# Altium schematic symbol library jlcpcb_2025_04_inductors_extended_0603.schlib: 1269 symbols (part 2 of 7) (continued)
## FHW0603UCR20JST
designator L?  Inductance: 200nH
Inductor, 200nH, ±5%, SMD 0603; Manufacturer: FH(Guangdong Fenghua Advanced Tech); Manufacturer Part Number: FHW0603UCR20JST; Package Size: 0603; JLCPCB Basic Part: No; JLCPCB Part Number: C395037; Supplier 1: LCSC; Category: Inductors; Supplier Part Number 1: C395037; Tolerance: ±5%; RoHS: Yes; ComponentLink1Description: Datasheet; ComponentLink1URL: https://wmsc.lcsc.com/wmsc/upload/file/pdf/v2/lcsc/2302231208_FH--Guangdong-Fenghua-Advanced-Tech-FHW0603UCR20JST_C395037.pdf; ComponentLink2Description: JLCPCB Part URL; ComponentLink2URL: https://jlcpcb.com/partdetail/C395037; ComponentLink3Description: LCSC Part URL; ComponentLink3URL: https://lcsc.com/product-detail/Inductors-SMD_FH-Guangdong-Fenghua-Advanced-Tech-FH-Guangdong-Fenghua-Advanced-Tech-FHW0603UCR20JST_C395037.html
footprint IND-0603 (0603 (1608M) Inductor)
pins: 1, 2

## FHW0603UCR22JST
designator L?  Inductance: 220nH
Inductor, 220nH, ±5%, 2.1Ω, 200mA, SMD 0603; Manufacturer: FH(Guangdong Fenghua Advanced Tech); Manufacturer Part Number: FHW0603UCR22JST; Self-Resonant Frequency: 900MHz; Q Factor: 25@100MHz; Package Size: 0603; JLCPCB Basic Part: No; JLCPCB Part Number: C295701; Supplier 1: LCSC; Category: Inductors; Supplier Part Number 1: C295701; Tolerance: ±5%; Rated Current: 200mA; DC Resistance: 2.1Ω; RoHS: Yes; ComponentLink1Description: Datasheet; ComponentLink1URL: https://wmsc.lcsc.com/wmsc/upload/file/pdf/v2/lcsc/2302231208_FH--Guangdong-Fenghua-Advanced-Tech-FHW0603UCR22JST_C295701.pdf; ComponentLink2Description: JLCPCB Part URL; ComponentLink2URL: https://jlcpcb.com/partdetail/C295701; ComponentLink3Description: LCSC Part URL; ComponentLink3URL: https://lcsc.com/product-detail/Inductors-SMD_FH-Guangdong-Fenghua-Advanced-Tech-FH-Guangdong-Fenghua-Advanced-Tech-FHW0603UCR22JST_C295701.html
footprint IND-0603 (0603 (1608M) Inductor)
pins: 1, 2

## FHW0603UCR27JST
designator L?  Inductance: 270nH
Inductor, 270nH, ±5%, 2.3Ω, 170mA, SMD 0603; Manufacturer: FH(Guangdong Fenghua Advanced Tech); Manufacturer Part Number: FHW0603UCR27JST; Self-Resonant Frequency: 900MHz; Q Factor: 24@100MHz; Package Size: 0603; JLCPCB Basic Part: No; JLCPCB Part Number: C317990; Supplier 1: LCSC; Category: Inductors; Supplier Part Number 1: C317990; Tolerance: ±5%; Rated Current: 170mA; DC Resistance: 2.3Ω; RoHS: Yes; ComponentLink1Description: Datasheet; ComponentLink1URL: https://wmsc.lcsc.com/wmsc/upload/file/pdf/v2/lcsc/2302231208_FH--Guangdong-Fenghua-Advanced-Tech-FHW0603UCR27JST_C317990.pdf; ComponentLink2Description: JLCPCB Part URL; ComponentLink2URL: https://jlcpcb.com/partdetail/C317990; ComponentLink3Description: LCSC Part URL; ComponentLink3URL: https://lcsc.com/product-detail/Inductors-SMD_FH-Guangdong-Fenghua-Advanced-Tech-FH-Guangdong-Fenghua-Advanced-Tech-FHW0603UCR27JST_C317990.html
footprint IND-0603 (0603 (1608M) Inductor)
pins: 1, 2

## FHW0603UCR39JST
designator L?  Inductance: 390nH
Inductor, 390nH, ±5%, 4.35Ω, 100mA, SMD 0603; Manufacturer: FH(Guangdong Fenghua Advanced Tech); Manufacturer Part Number: FHW0603UCR39JST; Self-Resonant Frequency: 800MHz; Q Factor: 25@100MHz; Package Size: 0603; JLCPCB Basic Part: No; JLCPCB Part Number: C295702; Supplier 1: LCSC; Category: Inductors; Supplier Part Number 1: C295702; Tolerance: ±5%; Rated Current: 100mA; DC Resistance: 4.35Ω; RoHS: Yes; ComponentLink1Description: Datasheet; ComponentLink1URL: https://wmsc.lcsc.com/wmsc/upload/file/pdf/v2/lcsc/2302231208_FH--Guangdong-Fenghua-Advanced-Tech-FHW0603UCR39JST_C295702.pdf; ComponentLink2Description: JLCPCB Part URL; ComponentLink2URL: https://jlcpcb.com/partdetail/C295702; ComponentLink3Description: LCSC Part URL; ComponentLink3URL: https://lcsc.com/product-detail/Inductors-SMD_FH-Guangdong-Fenghua-Advanced-Tech-FH-Guangdong-Fenghua-Advanced-Tech-FHW0603UCR39JST_C295702.html
footprint IND-0603 (0603 (1608M) Inductor)
pins: 1, 2

## FHW0603UCR47JST
designator L?  Inductance: 470nH
Inductor, 470nH, ±5%, 7Ω, 75mA, SMD 0603; Manufacturer: FH(Guangdong Fenghua Advanced Tech); Manufacturer Part Number: FHW0603UCR47JST; Self-Resonant Frequency: 700MHz; Q Factor: 25@100MHz; Package Size: 0603; JLCPCB Basic Part: No; JLCPCB Part Number: C395038; Supplier 1: LCSC; Category: Inductors; Supplier Part Number 1: C395038; Tolerance: ±5%; Rated Current: 75mA; DC Resistance: 7Ω; RoHS: Yes; ComponentLink1Description: Datasheet; ComponentLink1URL: https://wmsc.lcsc.com/wmsc/upload/file/pdf/v2/lcsc/2302231208_FH--Guangdong-Fenghua-Advanced-Tech-FHW0603UCR47JST_C395038.pdf; ComponentLink2Description: JLCPCB Part URL; ComponentLink2URL: https://jlcpcb.com/partdetail/C395038; ComponentLink3Description: LCSC Part URL; ComponentLink3URL: https://lcsc.com/product-detail/Inductors-SMD_FH-Guangdong-Fenghua-Advanced-Tech-FH-Guangdong-Fenghua-Advanced-Tech-FHW0603UCR47JST_C395038.html
footprint IND-0603 (0603 (1608M) Inductor)
pins: 1, 2

## FHW0603UF1R0JST
designator L?  Inductance: 1uH
Inductor, 1uH, ±5%, 1.5Ω, 330mA, SMD 0603; Manufacturer: FH(Guangdong Fenghua Advanced Tech); Manufacturer Part Number: FHW0603UF1R0JST; Self-Resonant Frequency: 400MHz; Q Factor: 12@7.9MHz; Package Size: 0603; JLCPCB Basic Part: No; JLCPCB Part Number: C127458; Supplier 1: LCSC; Category: Inductors; Supplier Part Number 1: C127458; Tolerance: ±5%; Rated Current: 330mA; DC Resistance: 1.5Ω; RoHS: Yes; ComponentLink1Description: Datasheet; ComponentLink1URL: https://wmsc.lcsc.com/wmsc/upload/file/pdf/v2/lcsc/2303141900_FH--Guangdong-Fenghua-Advanced-Tech-FHW0603UF1R0JST_C127458.pdf; ComponentLink2Description: JLCPCB Part URL; ComponentLink2URL: https://jlcpcb.com/partdetail/C127458; ComponentLink3Description: LCSC Part URL; ComponentLink3URL: https://lcsc.com/product-detail/Inductors-SMD_FH-Guangdong-Fenghua-Advanced-Tech-FH-Guangdong-Fenghua-Advanced-Tech-FHW0603UF1R0JST_C127458.html
footprint IND-0603 (0603 (1608M) Inductor)
pins: 1, 2

## FHW0603UF1R2JST
designator L?  Inductance: 1.2uH
Inductor, 1.2uH, ±5%, 1.7Ω, 320mA, SMD 0603; Manufacturer: FH(Guangdong Fenghua Advanced Tech); Manufacturer Part Number: FHW0603UF1R2JST; Self-Resonant Frequency: 380MHz; Q Factor: 12@7.9MHz; Package Size: 0603; JLCPCB Basic Part: No; JLCPCB Part Number: C393979; Supplier 1: LCSC; Category: Inductors; Supplier Part Number 1: C393979; Tolerance: ±5%; Rated Current: 320mA; DC Resistance: 1.7Ω; RoHS: Yes; ComponentLink1Description: Datasheet; ComponentLink1URL: https://wmsc.lcsc.com/wmsc/upload/file/pdf/v2/lcsc/2303141830_FH--Guangdong-Fenghua-Advanced-Tech-FHW0603UF1R2JST_C393979.pdf; ComponentLink2Description: JLCPCB Part URL; ComponentLink2URL: https://jlcpcb.com/partdetail/C393979; ComponentLink3Description: LCSC Part URL; ComponentLink3URL: https://lcsc.com/product-detail/Inductors-SMD_FH-Guangdong-Fenghua-Advanced-Tech-FH-Guangdong-Fenghua-Advanced-Tech-FHW0603UF1R2JST_C393979.html
footprint IND-0603 (0603 (1608M) Inductor)
pins: 1, 2

## FHW0603UF1R5JST
designator L?  Inductance: 1.5uH
Inductor, 1.5uH, ±5%, 1.9Ω, 310mA, SMD 0603; Manufacturer: FH(Guangdong Fenghua Advanced Tech); Manufacturer Part Number: FHW0603UF1R5JST; Self-Resonant Frequency: 300MHz; Q Factor: 12@7.9MHz; Package Size: 0603; JLCPCB Basic Part: No; JLCPCB Part Number: C393980; Supplier 1: LCSC; Category: Inductors; Supplier Part Number 1: C393980; Tolerance: ±5%; Rated Current: 310mA; DC Resistance: 1.9Ω; RoHS: Yes; ComponentLink1Description: Datasheet; ComponentLink1URL: https://wmsc.lcsc.com/wmsc/upload/file/pdf/v2/lcsc/2303141830_FH--Guangdong-Fenghua-Advanced-Tech-FHW0603UF1R5JST_C393980.pdf; ComponentLink2Description: JLCPCB Part URL; ComponentLink2URL: https://jlcpcb.com/partdetail/C393980; ComponentLink3Description: LCSC Part URL; ComponentLink3URL: https://lcsc.com/product-detail/Inductors-SMD_FH-Guangdong-Fenghua-Advanced-Tech-FH-Guangdong-Fenghua-Advanced-Tech-FHW0603UF1R5JST_C393980.html
footprint IND-0603 (0603 (1608M) Inductor)
pins: 1, 2

## FHW0603UF1R8JST
designator L?  Inductance: 1.8uH
Inductor, 1.8uH, ±5%, 2.2Ω, 300mA, SMD 0603; Manufacturer: FH(Guangdong Fenghua Advanced Tech); Manufacturer Part Number: FHW0603UF1R8JST; Self-Resonant Frequency: 180MHz; Q Factor: 12@7.9MHz; Package Size: 0603; JLCPCB Basic Part: No; JLCPCB Part Number: C393981; Supplier 1: LCSC; Category: Inductors; Supplier Part Number 1: C393981; Tolerance: ±5%; Rated Current: 300mA; DC Resistance: 2.2Ω; RoHS: Yes; ComponentLink1Description: Datasheet; ComponentLink1URL: https://wmsc.lcsc.com/wmsc/upload/file/pdf/v2/lcsc/2303141830_FH--Guangdong-Fenghua-Advanced-Tech-FHW0603UF1R8JST_C393981.pdf; ComponentLink2Description: JLCPCB Part URL; ComponentLink2URL: https://jlcpcb.com/partdetail/C393981; ComponentLink3Description: LCSC Part URL; ComponentLink3URL: https://lcsc.com/product-detail/Inductors-SMD_FH-Guangdong-Fenghua-Advanced-Tech-FH-Guangdong-Fenghua-Advanced-Tech-FHW0603UF1R8JST_C393981.html
footprint IND-0603 (0603 (1608M) Inductor)
pins: 1, 2

## FHW0603UF2R2JST
designator L?  Inductance: 2.2uH
Inductor, 2.2uH, ±5%, 2.3Ω, 280mA, SMD 0603; Manufacturer: FH(Guangdong Fenghua Advanced Tech); Manufacturer Part Number: FHW0603UF2R2JST; Self-Resonant Frequency: 180MHz; Q Factor: 12@7.9MHz; Package Size: 0603; JLCPCB Basic Part: No; JLCPCB Part Number: C393982; Supplier 1: LCSC; Category: Inductors; Supplier Part Number 1: C393982; Tolerance: ±5%; Rated Current: 280mA; DC Resistance: 2.3Ω; RoHS: Yes; ComponentLink1Description: Datasheet; ComponentLink1URL: https://wmsc.lcsc.com/wmsc/upload/file/pdf/v2/lcsc/2303141830_FH--Guangdong-Fenghua-Advanced-Tech-FHW0603UF2R2JST_C393982.pdf; ComponentLink2Description: JLCPCB Part URL; ComponentLink2URL: https://jlcpcb.com/partdetail/C393982; ComponentLink3Description: LCSC Part URL; ComponentLink3URL: https://lcsc.com/product-detail/Inductors-SMD_FH-Guangdong-Fenghua-Advanced-Tech-FH-Guangdong-Fenghua-Advanced-Tech-FHW0603UF2R2JST_C393982.html
footprint IND-0603 (0603 (1608M) Inductor)
pins: 1, 2

## FHW0603UF2R2KST
designator L?  Inductance: 2.2uH
Inductor, 2.2uH, ±10%, 2.3Ω, 280mA, SMD 0603; Manufacturer: FH(Guangdong Fenghua Advanced Tech); Manufacturer Part Number: FHW0603UF2R2KST; Package Size: 0603; JLCPCB Basic Part: No; JLCPCB Part Number: C127459; Supplier 1: LCSC; Category: Inductors; Supplier Part Number 1: C127459; Tolerance: ±10%; Rated Current: 280mA; DC Resistance: 2.3Ω; RoHS: Yes; ComponentLink1Description: Datasheet; ComponentLink1URL: https://wmsc.lcsc.com/wmsc/upload/file/pdf/v2/lcsc/2303141900_FH--Guangdong-Fenghua-Advanced-Tech-FHW0603UF2R2KST_C127459.pdf; ComponentLink2Description: JLCPCB Part URL; ComponentLink2URL: https://jlcpcb.com/partdetail/C127459; ComponentLink3Description: LCSC Part URL; ComponentLink3URL: https://lcsc.com/product-detail/Inductors-SMD_FH-Guangdong-Fenghua-Advanced-Tech-FH-Guangdong-Fenghua-Advanced-Tech-FHW0603UF2R2KST_C127459.html
footprint IND-0603 (0603 (1608M) Inductor)
pins: 1, 2

## FHW0603UF2R7JST
designator L?  Inductance: 2.7uH
Inductor, 2.7uH, ±5%, 3.1Ω, 250mA, SMD 0603; Manufacturer: FH(Guangdong Fenghua Advanced Tech); Manufacturer Part Number: FHW0603UF2R7JST; Self-Resonant Frequency: 150MHz; Q Factor: 12@7.9MHz; Package Size: 0603; JLCPCB Basic Part: No; JLCPCB Part Number: C304273; Supplier 1: LCSC; Category: Inductors; Supplier Part Number 1: C304273; Tolerance: ±5%; Rated Current: 250mA; DC Resistance: 3.1Ω; RoHS: Yes; ComponentLink1Description: Datasheet; ComponentLink1URL: https://wmsc.lcsc.com/wmsc/upload/file/pdf/v2/lcsc/2303141830_FH--Guangdong-Fenghua-Advanced-Tech-FHW0603UF2R7JST_C304273.pdf; ComponentLink2Description: JLCPCB Part URL; ComponentLink2URL: https://jlcpcb.com/partdetail/C304273; ComponentLink3Description: LCSC Part URL; ComponentLink3URL: https://lcsc.com/product-detail/Inductors-SMD_FH-Guangdong-Fenghua-Advanced-Tech-FH-Guangdong-Fenghua-Advanced-Tech-FHW0603UF2R7JST_C304273.html
footprint IND-0603 (0603 (1608M) Inductor)
pins: 1, 2

## FHW0603UF3R3JST
designator L?  Inductance: 3.3uH
Inductor, 3.3uH, ±5%, 2.9Ω, 230mA, SMD 0603; Manufacturer: FH(Guangdong Fenghua Advanced Tech); Manufacturer Part Number: FHW0603UF3R3JST; Self-Resonant Frequency: 150MHz; Q Factor: 12@7.9MHz; Package Size: 0603; JLCPCB Basic Part: No; JLCPCB Part Number: C393983; Supplier 1: LCSC; Category: Inductors; Supplier Part Number 1: C393983; Tolerance: ±5%; Rated Current: 230mA; DC Resistance: 2.9Ω; RoHS: Yes; ComponentLink1Description: Datasheet; ComponentLink1URL: https://wmsc.lcsc.com/wmsc/upload/file/pdf/v2/lcsc/2303141830_FH--Guangdong-Fenghua-Advanced-Tech-FHW0603UF3R3JST_C393983.pdf; ComponentLink2Description: JLCPCB Part URL; ComponentLink2URL: https://jlcpcb.com/partdetail/C393983; ComponentLink3Description: LCSC Part URL; ComponentLink3URL: https://lcsc.com/product-detail/Inductors-SMD_FH-Guangdong-Fenghua-Advanced-Tech-FH-Guangdong-Fenghua-Advanced-Tech-FHW0603UF3R3JST_C393983.html
footprint IND-0603 (0603 (1608M) Inductor)
pins: 1, 2

## FHW0603UF3R9JST
designator L?  Inductance: 3.9uH
Inductor, 3.9uH, ±5%, 3.2Ω, 210mA, SMD 0603; Manufacturer: FH(Guangdong Fenghua Advanced Tech); Manufacturer Part Number: FHW0603UF3R9JST; Self-Resonant Frequency: 120MHz; Q Factor: 12@7.9MHz; Package Size: 0603; JLCPCB Basic Part: No; JLCPCB Part Number: C393984; Supplier 1: LCSC; Category: Inductors; Supplier Part Number 1: C393984; Tolerance: ±5%; Rated Current: 210mA; DC Resistance: 3.2Ω; RoHS: Yes; ComponentLink1Description: Datasheet; ComponentLink1URL: https://wmsc.lcsc.com/wmsc/upload/file/pdf/v2/lcsc/2303141830_FH--Guangdong-Fenghua-Advanced-Tech-FHW0603UF3R9JST_C393984.pdf; ComponentLink2Description: JLCPCB Part URL; ComponentLink2URL: https://jlcpcb.com/partdetail/C393984; ComponentLink3Description: LCSC Part URL; ComponentLink3URL: https://lcsc.com/product-detail/Inductors-SMD_FH-Guangdong-Fenghua-Advanced-Tech-FH-Guangdong-Fenghua-Advanced-Tech-FHW0603UF3R9JST_C393984.html
footprint IND-0603 (0603 (1608M) Inductor)
pins: 1, 2

## FHW0603UF4R7JST
designator L?  Inductance: 4.7uH
Inductor, 4.7uH, ±5%, 4Ω, 200mA, SMD 0603; Manufacturer: FH(Guangdong Fenghua Advanced Tech); Manufacturer Part Number: FHW0603UF4R7JST; Self-Resonant Frequency: 100MHz; Q Factor: 12@7.9MHz; Package Size: 0603; JLCPCB Basic Part: No; JLCPCB Part Number: C393985; Supplier 1: LCSC; Category: Inductors; Supplier Part Number 1: C393985; Tolerance: ±5%; Rated Current: 200mA; DC Resistance: 4Ω; RoHS: Yes; ComponentLink1Description: Datasheet; ComponentLink1URL: https://wmsc.lcsc.com/wmsc/upload/file/pdf/v2/lcsc/2303141830_FH--Guangdong-Fenghua-Advanced-Tech-FHW0603UF4R7JST_C393985.pdf; ComponentLink2Description: JLCPCB Part URL; ComponentLink2URL: https://jlcpcb.com/partdetail/C393985; ComponentLink3Description: LCSC Part URL; ComponentLink3URL: https://lcsc.com/product-detail/Inductors-SMD_FH-Guangdong-Fenghua-Advanced-Tech-FH-Guangdong-Fenghua-Advanced-Tech-FHW0603UF4R7JST_C393985.html
footprint IND-0603 (0603 (1608M) Inductor)
pins: 1, 2

## FHW0603UF047JST
designator L?  Inductance: 47nH
Inductor, 47nH, SMD 0603; Manufacturer: FH (Guangdong Fenghua Advanced Tech); Manufacturer Part Number: FHW0603UF047JST; Package Size: 0603; JLCPCB Basic Part: No; JLCPCB Part Number: C75637; Supplier 1: LCSC; Category: Inductors; Supplier Part Number 1: C75637; RoHS: Yes; ComponentLink1Description: Datasheet; ComponentLink1URL: https://wmsc.lcsc.com/wmsc/upload/file/pdf/v2/lcsc/2303141630_FH--Guangdong-Fenghua-Advanced-Tech-FHW0603UF047JST_C75637.pdf; ComponentLink2Description: JLCPCB Part URL; ComponentLink2URL: https://jlcpcb.com/partdetail/C75637; ComponentLink3Description: LCSC Part URL; ComponentLink3URL: https://lcsc.com/product-detail/Inductors-SMD_FH-Guangdong-Fenghua-Advanced-Tech-FH-Guangdong-Fenghua-Advanced-Tech-FHW0603UF047JST_C75637.html
footprint IND-0603 (0603 (1608M) Inductor)
pins: 1, 2

## FHW0603UFR10JST
designator L?  Inductance: 100nH
Inductor, 100nH, ±5%, 130mΩ, 1A, SMD 0603; Manufacturer: FH(Guangdong Fenghua Advanced Tech); Manufacturer Part Number: FHW0603UFR10JST; Self-Resonant Frequency: 1.15GHz; Q Factor: 12@7.9MHz; Package Size: 0603; JLCPCB Basic Part: No; JLCPCB Part Number: C393970; Supplier 1: LCSC; Category: Inductors; Supplier Part Number 1: C393970; Tolerance: ±5%; Rated Current: 1A; DC Resistance: 130mΩ; RoHS: Yes; ComponentLink1Description: Datasheet; ComponentLink1URL: https://wmsc.lcsc.com/wmsc/upload/file/pdf/v2/lcsc/2303141830_FH--Guangdong-Fenghua-Advanced-Tech-FHW0603UFR10JST_C393970.pdf; ComponentLink2Description: JLCPCB Part URL; ComponentLink2URL: https://jlcpcb.com/partdetail/C393970; ComponentLink3Description: LCSC Part URL; ComponentLink3URL: https://lcsc.com/product-detail/Inductors-SMD_FH-Guangdong-Fenghua-Advanced-Tech-FH-Guangdong-Fenghua-Advanced-Tech-FHW0603UFR10JST_C393970.html
footprint IND-0603 (0603 (1608M) Inductor)
pins: 1, 2

## FHW0603UFR12JST
designator L?  Inductance: 120nH
Inductor, 120nH, ±5%, 160mΩ, 1A, SMD 0603; Manufacturer: FH(Guangdong Fenghua Advanced Tech); Manufacturer Part Number: FHW0603UFR12JST; Self-Resonant Frequency: 1.1GHz; Q Factor: 12@7.9MHz; Package Size: 0603; JLCPCB Basic Part: No; JLCPCB Part Number: C393971; Supplier 1: LCSC; Category: Inductors; Supplier Part Number 1: C393971; Tolerance: ±5%; Rated Current: 1A; DC Resistance: 160mΩ; RoHS: Yes; ComponentLink1Description: Datasheet; ComponentLink1URL: https://wmsc.lcsc.com/wmsc/upload/file/pdf/v2/lcsc/2303141830_FH--Guangdong-Fenghua-Advanced-Tech-FHW0603UFR12JST_C393971.pdf; ComponentLink2Description: JLCPCB Part URL; ComponentLink2URL: https://jlcpcb.com/partdetail/C393971; ComponentLink3Description: LCSC Part URL; ComponentLink3URL: https://lcsc.com/product-detail/Inductors-SMD_FH-Guangdong-Fenghua-Advanced-Tech-FH-Guangdong-Fenghua-Advanced-Tech-FHW0603UFR12JST_C393971.html
footprint IND-0603 (0603 (1608M) Inductor)
pins: 1, 2

## FHW0603UFR18JST
designator L?  Inductance: 180nH
Inductor, 180nH, ±5%, 150mΩ, 1A, SMD 0603; Manufacturer: FH(Guangdong Fenghua Advanced Tech); Manufacturer Part Number: FHW0603UFR18JST; Self-Resonant Frequency: 950MHz; Q Factor: 12@7.9MHz; Package Size: 0603; JLCPCB Basic Part: No; JLCPCB Part Number: C393973; Supplier 1: LCSC; Category: Inductors; Supplier Part Number 1: C393973; Tolerance: ±5%; Rated Current: 1A; DC Resistance: 150mΩ; RoHS: Yes; ComponentLink1Description: Datasheet; ComponentLink1URL: https://wmsc.lcsc.com/wmsc/upload/file/pdf/v2/lcsc/2303141830_FH--Guangdong-Fenghua-Advanced-Tech-FHW0603UFR18JST_C393973.pdf; ComponentLink2Description: JLCPCB Part URL; ComponentLink2URL: https://jlcpcb.com/partdetail/C393973; ComponentLink3Description: LCSC Part URL; ComponentLink3URL: https://lcsc.com/product-detail/Inductors-SMD_FH-Guangdong-Fenghua-Advanced-Tech-FH-Guangdong-Fenghua-Advanced-Tech-FHW0603UFR18JST_C393973.html
footprint IND-0603 (0603 (1608M) Inductor)
pins: 1, 2

## FHW0603UFR22JST
designator L?  Inductance: 220nH
Inductor, 220nH, ±5%, 200mΩ, 900mA, SMD 0603; Manufacturer: FH(Guangdong Fenghua Advanced Tech); Manufacturer Part Number: FHW0603UFR22JST; Self-Resonant Frequency: 900MHz; Q Factor: 12@7.9MHz; Package Size: 0603; JLCPCB Basic Part: No; JLCPCB Part Number: C393974; Supplier 1: LCSC; Category: Inductors; Supplier Part Number 1: C393974; Tolerance: ±5%; Rated Current: 900mA; DC Resistance: 200mΩ; RoHS: Yes; ComponentLink1Description: Datasheet; ComponentLink1URL: https://wmsc.lcsc.com/wmsc/upload/file/pdf/v2/lcsc/2303141830_FH--Guangdong-Fenghua-Advanced-Tech-FHW0603UFR22JST_C393974.pdf; ComponentLink2Description: JLCPCB Part URL; ComponentLink2URL: https://jlcpcb.com/partdetail/C393974; ComponentLink3Description: LCSC Part URL; ComponentLink3URL: https://lcsc.com/product-detail/Inductors-SMD_FH-Guangdong-Fenghua-Advanced-Tech-FH-Guangdong-Fenghua-Advanced-Tech-FHW0603UFR22JST_C393974.html
footprint IND-0603 (0603 (1608M) Inductor)
pins: 1, 2

## FHW0603UFR27JST
designator L?  Inductance: 270nH
Inductor, 270nH, ±5%, 300mΩ, 700mA, SMD 0603; Manufacturer: FH(Guangdong Fenghua Advanced Tech); Manufacturer Part Number: FHW0603UFR27JST; Self-Resonant Frequency: 775MHz; Q Factor: 12@7.9MHz; Package Size: 0603; JLCPCB Basic Part: No; JLCPCB Part Number: C393975; Supplier 1: LCSC; Category: Inductors; Supplier Part Number 1: C393975; Tolerance: ±5%; Rated Current: 700mA; DC Resistance: 300mΩ; RoHS: Yes; ComponentLink1Description: Datasheet; ComponentLink1URL: https://wmsc.lcsc.com/wmsc/upload/file/pdf/v2/lcsc/2303141830_FH--Guangdong-Fenghua-Advanced-Tech-FHW0603UFR27JST_C393975.pdf; ComponentLink2Description: JLCPCB Part URL; ComponentLink2URL: https://jlcpcb.com/partdetail/C393975; ComponentLink3Description: LCSC Part URL; ComponentLink3URL: https://lcsc.com/product-detail/Inductors-SMD_FH-Guangdong-Fenghua-Advanced-Tech-FH-Guangdong-Fenghua-Advanced-Tech-FHW0603UFR27JST_C393975.html
footprint IND-0603 (0603 (1608M) Inductor)
pins: 1, 2

## FHW0603UFR33JST
designator L?  Inductance: 330nH
Inductor, 330nH, ±5%, 320mΩ, 600mA, SMD 0603; Manufacturer: FH(Guangdong Fenghua Advanced Tech); Manufacturer Part Number: FHW0603UFR33JST; Self-Resonant Frequency: 725MHz; Q Factor: 12@7.9MHz; Package Size: 0603; JLCPCB Basic Part: No; JLCPCB Part Number: C393976; Supplier 1: LCSC; Category: Inductors; Supplier Part Number 1: C393976; Tolerance: ±5%; Rated Current: 600mA; DC Resistance: 320mΩ; RoHS: Yes; ComponentLink1Description: Datasheet; ComponentLink1URL: https://wmsc.lcsc.com/wmsc/upload/file/pdf/v2/lcsc/2303141830_FH--Guangdong-Fenghua-Advanced-Tech-FHW0603UFR33JST_C393976.pdf; ComponentLink2Description: JLCPCB Part URL; ComponentLink2URL: https://jlcpcb.com/partdetail/C393976; ComponentLink3Description: LCSC Part URL; ComponentLink3URL: https://lcsc.com/product-detail/Inductors-SMD_FH-Guangdong-Fenghua-Advanced-Tech-FH-Guangdong-Fenghua-Advanced-Tech-FHW0603UFR33JST_C393976.html
footprint IND-0603 (0603 (1608M) Inductor)
pins: 1, 2

## FHW0603UFR39JST
designator L?  Inductance: 390nH
Inductor, 390nH, ±5%, 510mΩ, 500mA, SMD 0603; Manufacturer: FH(Guangdong Fenghua Advanced Tech); Manufacturer Part Number: FHW0603UFR39JST; Self-Resonant Frequency: 620MHz; Q Factor: 12@7.9MHz; Package Size: 0603; JLCPCB Basic Part: No; JLCPCB Part Number: C393977; Supplier 1: LCSC; Category: Inductors; Supplier Part Number 1: C393977; Tolerance: ±5%; Rated Current: 500mA; DC Resistance: 510mΩ; RoHS: Yes; ComponentLink1Description: Datasheet; ComponentLink1URL: https://wmsc.lcsc.com/wmsc/upload/file/pdf/v2/lcsc/2303141830_FH--Guangdong-Fenghua-Advanced-Tech-FHW0603UFR39JST_C393977.pdf; ComponentLink2Description: JLCPCB Part URL; ComponentLink2URL: https://jlcpcb.com/partdetail/C393977; ComponentLink3Description: LCSC Part URL; ComponentLink3URL: https://lcsc.com/product-detail/Inductors-SMD_FH-Guangdong-Fenghua-Advanced-Tech-FH-Guangdong-Fenghua-Advanced-Tech-FHW0603UFR39JST_C393977.html
footprint IND-0603 (0603 (1608M) Inductor)
pins: 1, 2

## FHW0603UFR47JST
designator L?  Inductance: 470nH
Inductor, 470nH, ±5%, 620mΩ, 420mA, SMD 0603; Manufacturer: FH(Guangdong Fenghua Advanced Tech); Manufacturer Part Number: FHW0603UFR47JST; Self-Resonant Frequency: 540MHz; Q Factor: 12@7.9MHz; Package Size: 0603; JLCPCB Basic Part: No; JLCPCB Part Number: C127457; Supplier 1: LCSC; Category: Inductors; Supplier Part Number 1: C127457; Tolerance: ±5%; Rated Current: 420mA; DC Resistance: 620mΩ; RoHS: Yes; ComponentLink1Description: Datasheet; ComponentLink1URL: https://wmsc.lcsc.com/wmsc/upload/file/pdf/v2/lcsc/2303141900_FH--Guangdong-Fenghua-Advanced-Tech-FHW0603UFR47JST_C127457.pdf; ComponentLink2Description: JLCPCB Part URL; ComponentLink2URL: https://jlcpcb.com/partdetail/C127457; ComponentLink3Description: LCSC Part URL; ComponentLink3URL: https://lcsc.com/product-detail/Inductors-SMD_FH-Guangdong-Fenghua-Advanced-Tech-FH-Guangdong-Fenghua-Advanced-Tech-FHW0603UFR47JST_C127457.html
footprint IND-0603 (0603 (1608M) Inductor)
pins: 1, 2

## FHW0603UFR56JST
designator L?  Inductance: 560nH
Inductor, 560nH, ±5%, 650mΩ, 400mA, SMD 0603; Manufacturer: FH(Guangdong Fenghua Advanced Tech); Manufacturer Part Number: FHW0603UFR56JST; Self-Resonant Frequency: 600MHz; Q Factor: 12@7.9MHz; Package Size: 0603; JLCPCB Basic Part: No; JLCPCB Part Number: C185915; Supplier 1: LCSC; Category: Inductors; Supplier Part Number 1: C185915; Tolerance: ±5%; Rated Current: 400mA; DC Resistance: 650mΩ; RoHS: Yes; ComponentLink1Description: Datasheet; ComponentLink1URL: https://wmsc.lcsc.com/wmsc/upload/file/pdf/v2/lcsc/2303141830_FH--Guangdong-Fenghua-Advanced-Tech-FHW0603UFR56JST_C185915.pdf; ComponentLink2Description: JLCPCB Part URL; ComponentLink2URL: https://jlcpcb.com/partdetail/C185915; ComponentLink3Description: LCSC Part URL; ComponentLink3URL: https://lcsc.com/product-detail/Inductors-SMD_FH-Guangdong-Fenghua-Advanced-Tech-FH-Guangdong-Fenghua-Advanced-Tech-FHW0603UFR56JST_C185915.html
footprint IND-0603 (0603 (1608M) Inductor)
pins: 1, 2

## FHW0603UFR68JST
designator L?  Inductance: 680nH
Inductor, 680nH, ±5%, 1Ω, 380mA, SMD 0603; Manufacturer: FH(Guangdong Fenghua Advanced Tech); Manufacturer Part Number: FHW0603UFR68JST; Self-Resonant Frequency: 500MHz; Q Factor: 12@7.9MHz; Package Size: 0603; JLCPCB Basic Part: No; JLCPCB Part Number: C185916; Supplier 1: LCSC; Category: Inductors; Supplier Part Number 1: C185916; Tolerance: ±5%; Rated Current: 380mA; DC Resistance: 1Ω; RoHS: Yes; ComponentLink1Description: Datasheet; ComponentLink1URL: https://wmsc.lcsc.com/wmsc/upload/file/pdf/v2/lcsc/2303141830_FH--Guangdong-Fenghua-Advanced-Tech-FHW0603UFR68JST_C185916.pdf; ComponentLink2Description: JLCPCB Part URL; ComponentLink2URL: https://jlcpcb.com/partdetail/C185916; ComponentLink3Description: LCSC Part URL; ComponentLink3URL: https://lcsc.com/product-detail/Inductors-SMD_FH-Guangdong-Fenghua-Advanced-Tech-FH-Guangdong-Fenghua-Advanced-Tech-FHW0603UFR68JST_C185916.html
footprint IND-0603 (0603 (1608M) Inductor)
pins: 1, 2

## FHW0603UFR82JST
designator L?  Inductance: 820nH
Inductor, 820nH, ±5%, 1.3Ω, 350mA, SMD 0603; Manufacturer: FH(Guangdong Fenghua Advanced Tech); Manufacturer Part Number: FHW0603UFR82JST; Self-Resonant Frequency: 500MHz; Q Factor: 12@7.9MHz; Package Size: 0603; JLCPCB Basic Part: No; JLCPCB Part Number: C393978; Supplier 1: LCSC; Category: Inductors; Supplier Part Number 1: C393978; Tolerance: ±5%; Rated Current: 350mA; DC Resistance: 1.3Ω; RoHS: Yes; ComponentLink1Description: Datasheet; ComponentLink1URL: https://wmsc.lcsc.com/wmsc/upload/file/pdf/v2/lcsc/2303141830_FH--Guangdong-Fenghua-Advanced-Tech-FHW0603UFR82JST_C393978.pdf; ComponentLink2Description: JLCPCB Part URL; ComponentLink2URL: https://jlcpcb.com/partdetail/C393978; ComponentLink3Description: LCSC Part URL; ComponentLink3URL: https://lcsc.com/product-detail/Inductors-SMD_FH-Guangdong-Fenghua-Advanced-Tech-FH-Guangdong-Fenghua-Advanced-Tech-FHW0603UFR82JST_C393978.html
footprint IND-0603 (0603 (1608M) Inductor)
pins: 1, 2

## HBLS1608-1N0S
designator L?  Inductance: 1nH
Inductor, 1nH, 0.05Ω, 500mA, SMD 0603; Manufacturer: HYHONGYEX; Manufacturer Part Number: HBLS1608-1N0S; Self-Resonant Frequency: 10GHz; Q Factor: 8@100MHz; Package Size: 0603; JLCPCB Basic Part: No; JLCPCB Part Number: C964016; Supplier 1: LCSC; Category: Inductors; Supplier Part Number 1: C964016; Rated Current: 500mA; DC Resistance: 0.05Ω; RoHS: Yes; ComponentLink1Description: Datasheet; ComponentLink1URL: https://wmsc.lcsc.com/wmsc/upload/file/pdf/v2/lcsc/2012171917_HYHONGYEX-HBLS1608-1N0S_C964016.pdf; ComponentLink2Description: JLCPCB Part URL; ComponentLink2URL: https://jlcpcb.com/partdetail/C964016; ComponentLink3Description: LCSC Part URL; ComponentLink3URL: https://lcsc.com/product-detail/Inductors-SMD_HYHONGYEX-HYHONGYEX-HBLS1608-1N0S_C964016.html
footprint IND-0603 (0603 (1608M) Inductor)
pins: 1, 2

## HBLS1608-1N5S
designator L?  Inductance: 1.5nH
Inductor, 1.5nH, 0.1Ω, 500mA, SMD 0603; Manufacturer: HYHONGYEX; Manufacturer Part Number: HBLS1608-1N5S; Self-Resonant Frequency: 6GHz; Q Factor: 8@100MHz; Package Size: 0603; JLCPCB Basic Part: No; JLCPCB Part Number: C964018; Supplier 1: LCSC; Category: Inductors; Supplier Part Number 1: C964018; Rated Current: 500mA; DC Resistance: 0.1Ω; RoHS: Yes; ComponentLink1Description: Datasheet; ComponentLink1URL: https://wmsc.lcsc.com/wmsc/upload/file/pdf/v2/lcsc/2012171917_HYHONGYEX-HBLS1608-1N5S_C964018.pdf; ComponentLink2Description: JLCPCB Part URL; ComponentLink2URL: https://jlcpcb.com/partdetail/C964018; ComponentLink3Description: LCSC Part URL; ComponentLink3URL: https://lcsc.com/product-detail/Inductors-SMD_HYHONGYEX-HYHONGYEX-HBLS1608-1N5S_C964018.html
footprint IND-0603 (0603 (1608M) Inductor)
pins: 1, 2

## HBLS1608-1N8S
designator L?  Inductance: 1.8nH
Inductor, 1.8nH, 0.1Ω, 500mA, SMD 0603; Manufacturer: HYHONGYEX; Manufacturer Part Number: HBLS1608-1N8S; Self-Resonant Frequency: 6GHz; Q Factor: 8@100MHz; Package Size: 0603; JLCPCB Basic Part: No; JLCPCB Part Number: C964019; Supplier 1: LCSC; Category: Inductors; Supplier Part Number 1: C964019; Rated Current: 500mA; DC Resistance: 0.1Ω; RoHS: Yes; ComponentLink1Description: Datasheet; ComponentLink1URL: https://wmsc.lcsc.com/wmsc/upload/file/pdf/v2/lcsc/2012171917_HYHONGYEX-HBLS1608-1N8S_C964019.pdf; ComponentLink2Description: JLCPCB Part URL; ComponentLink2URL: https://jlcpcb.com/partdetail/C964019; ComponentLink3Description: LCSC Part URL; ComponentLink3URL: https://lcsc.com/product-detail/Inductors-SMD_HYHONGYEX-HYHONGYEX-HBLS1608-1N8S_C964019.html
footprint IND-0603 (0603 (1608M) Inductor)
pins: 1, 2

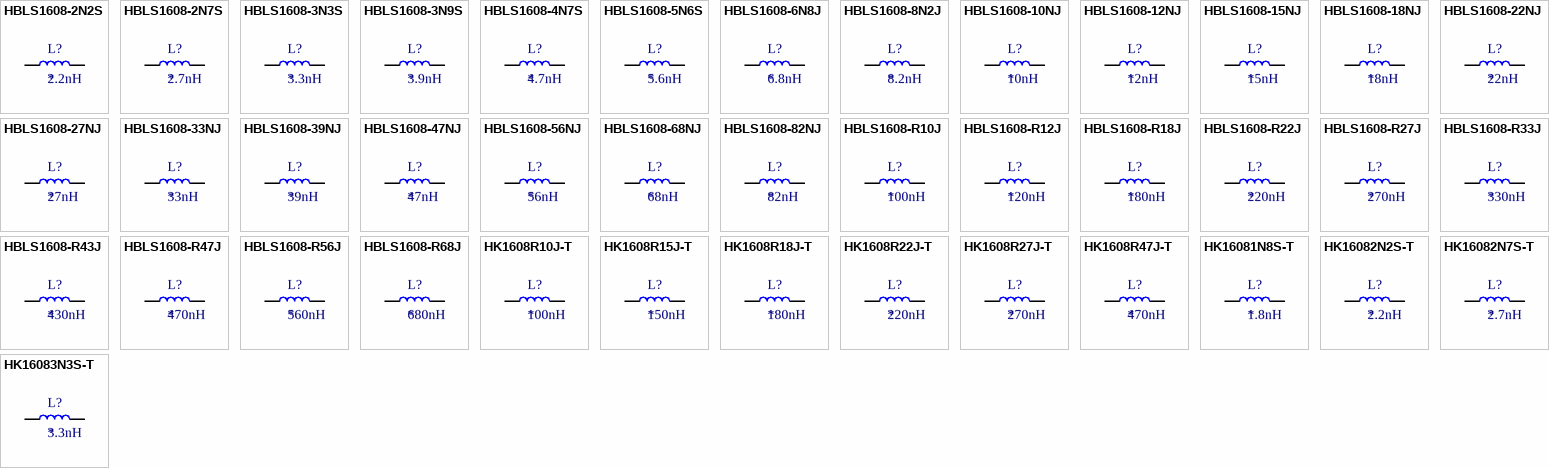
[diagram p9: symbols HBLS1608-2N2S to HK16083N3S-T]

## HBLS1608-2N2S
designator L?  Inductance: 2.2nH
Inductor, 2.2nH, 0.1Ω, 500mA, SMD 0603; Manufacturer: HYHONGYEX; Manufacturer Part Number: HBLS1608-2N2S; Self-Resonant Frequency: 6GHz; Q Factor: 8@100MHz; Package Size: 0603; JLCPCB Basic Part: No; JLCPCB Part Number: C964020; Supplier 1: LCSC; Category: Inductors; Supplier Part Number 1: C964020; Rated Current: 500mA; DC Resistance: 0.1Ω; RoHS: Yes; ComponentLink1Description: Datasheet; ComponentLink1URL: https://wmsc.lcsc.com/wmsc/upload/file/pdf/v2/lcsc/2012171917_HYHONGYEX-HBLS1608-2N2S_C964020.pdf; ComponentLink2Description: JLCPCB Part URL; ComponentLink2URL: https://jlcpcb.com/partdetail/C964020; ComponentLink3Description: LCSC Part URL; ComponentLink3URL: https://lcsc.com/product-detail/Inductors-SMD_HYHONGYEX-HYHONGYEX-HBLS1608-2N2S_C964020.html
footprint IND-0603 (0603 (1608M) Inductor)
pins: 1, 2

## HBLS1608-2N7S
designator L?  Inductance: 2.7nH
Inductor, 2.7nH, 0.12Ω, 500mA, SMD 0603; Manufacturer: HYHONGYEX; Manufacturer Part Number: HBLS1608-2N7S; Self-Resonant Frequency: 6GHz; Q Factor: 10@100MHz; Package Size: 0603; JLCPCB Basic Part: No; JLCPCB Part Number: C964021; Supplier 1: LCSC; Category: Inductors; Supplier Part Number 1: C964021; Rated Current: 500mA; DC Resistance: 0.12Ω; RoHS: Yes; ComponentLink1Description: Datasheet; ComponentLink1URL: https://wmsc.lcsc.com/wmsc/upload/file/pdf/v2/lcsc/2012171917_HYHONGYEX-HBLS1608-2N7S_C964021.pdf; ComponentLink2Description: JLCPCB Part URL; ComponentLink2URL: https://jlcpcb.com/partdetail/C964021; ComponentLink3Description: LCSC Part URL; ComponentLink3URL: https://lcsc.com/product-detail/Inductors-SMD_HYHONGYEX-HYHONGYEX-HBLS1608-2N7S_C964021.html
footprint IND-0603 (0603 (1608M) Inductor)
pins: 1, 2

## HBLS1608-3N3S
designator L?  Inductance: 3.3nH
Inductor, 3.3nH, 0.15Ω, 500mA, SMD 0603; Manufacturer: HYHONGYEX; Manufacturer Part Number: HBLS1608-3N3S; Self-Resonant Frequency: 6GHz; Q Factor: 10@100MHz; Package Size: 0603; JLCPCB Basic Part: No; JLCPCB Part Number: C964022; Supplier 1: LCSC; Category: Inductors; Supplier Part Number 1: C964022; Rated Current: 500mA; DC Resistance: 0.15Ω; RoHS: Yes; ComponentLink1Description: Datasheet; ComponentLink1URL: https://wmsc.lcsc.com/wmsc/upload/file/pdf/v2/lcsc/2012171917_HYHONGYEX-HBLS1608-3N3S_C964022.pdf; ComponentLink2Description: JLCPCB Part URL; ComponentLink2URL: https://jlcpcb.com/partdetail/C964022; ComponentLink3Description: LCSC Part URL; ComponentLink3URL: https://lcsc.com/product-detail/Inductors-SMD_HYHONGYEX-HYHONGYEX-HBLS1608-3N3S_C964022.html
footprint IND-0603 (0603 (1608M) Inductor)
pins: 1, 2

## HBLS1608-3N9S
designator L?  Inductance: 3.9nH
Inductor, 3.9nH, 0.16Ω, 500mA, SMD 0603; Manufacturer: HYHONGYEX; Manufacturer Part Number: HBLS1608-3N9S; Self-Resonant Frequency: 6GHz; Q Factor: 10@100MHz; Package Size: 0603; JLCPCB Basic Part: No; JLCPCB Part Number: C964023; Supplier 1: LCSC; Category: Inductors; Supplier Part Number 1: C964023; Rated Current: 500mA; DC Resistance: 0.16Ω; RoHS: Yes; ComponentLink1Description: Datasheet; ComponentLink1URL: https://wmsc.lcsc.com/wmsc/upload/file/pdf/v2/lcsc/2012171917_HYHONGYEX-HBLS1608-3N9S_C964023.pdf; ComponentLink2Description: JLCPCB Part URL; ComponentLink2URL: https://jlcpcb.com/partdetail/C964023; ComponentLink3Description: LCSC Part URL; ComponentLink3URL: https://lcsc.com/product-detail/Inductors-SMD_HYHONGYEX-HYHONGYEX-HBLS1608-3N9S_C964023.html
footprint IND-0603 (0603 (1608M) Inductor)
pins: 1, 2

## HBLS1608-4N7S
designator L?  Inductance: 4.7nH
Inductor, 4.7nH, 0.2Ω, 500mA, SMD 0603; Manufacturer: HYHONGYEX; Manufacturer Part Number: HBLS1608-4N7S; Self-Resonant Frequency: 6GHz; Q Factor: 10@100MHz; Package Size: 0603; JLCPCB Basic Part: No; JLCPCB Part Number: C964024; Supplier 1: LCSC; Category: Inductors; Supplier Part Number 1: C964024; Rated Current: 500mA; DC Resistance: 0.2Ω; RoHS: Yes; ComponentLink1Description: Datasheet; ComponentLink1URL: https://wmsc.lcsc.com/wmsc/upload/file/pdf/v2/lcsc/2012171917_HYHONGYEX-HBLS1608-4N7S_C964024.pdf; ComponentLink2Description: JLCPCB Part URL; ComponentLink2URL: https://jlcpcb.com/partdetail/C964024; ComponentLink3Description: LCSC Part URL; ComponentLink3URL: https://lcsc.com/product-detail/Inductors-SMD_HYHONGYEX-HYHONGYEX-HBLS1608-4N7S_C964024.html
footprint IND-0603 (0603 (1608M) Inductor)
pins: 1, 2

## HBLS1608-5N6S
designator L?  Inductance: 5.6nH
Inductor, 5.6nH, 0.25Ω, 500mA, SMD 0603; Manufacturer: HYHONGYEX; Manufacturer Part Number: HBLS1608-5N6S; Self-Resonant Frequency: 5GHz; Q Factor: 10@100MHz; Package Size: 0603; JLCPCB Basic Part: No; JLCPCB Part Number: C964025; Supplier 1: LCSC; Category: Inductors; Supplier Part Number 1: C964025; Rated Current: 500mA; DC Resistance: 0.25Ω; RoHS: Yes; ComponentLink1Description: Datasheet; ComponentLink1URL: https://wmsc.lcsc.com/wmsc/upload/file/pdf/v2/lcsc/2012171917_HYHONGYEX-HBLS1608-5N6S_C964025.pdf; ComponentLink2Description: JLCPCB Part URL; ComponentLink2URL: https://jlcpcb.com/partdetail/C964025; ComponentLink3Description: LCSC Part URL; ComponentLink3URL: https://lcsc.com/product-detail/Inductors-SMD_HYHONGYEX-HYHONGYEX-HBLS1608-5N6S_C964025.html
footprint IND-0603 (0603 (1608M) Inductor)
pins: 1, 2

## HBLS1608-6N8J
designator L?  Inductance: 6.8nH
Inductor, 6.8nH, ±5%, 0.3Ω, 500mA, SMD 0603; Manufacturer: HYHONGYEX; Manufacturer Part Number: HBLS1608-6N8J; Self-Resonant Frequency: 5GHz; Q Factor: 10@100MHz; Package Size: 0603; JLCPCB Basic Part: No; JLCPCB Part Number: C964026; Supplier 1: LCSC; Category: Inductors; Supplier Part Number 1: C964026; Tolerance: ±5%; Rated Current: 500mA; DC Resistance: 0.3Ω; RoHS: Yes; ComponentLink1Description: Datasheet; ComponentLink1URL: https://wmsc.lcsc.com/wmsc/upload/file/pdf/v2/lcsc/2012171938_HYHONGYEX-HBLS1608-6N8J_C964026.pdf; ComponentLink2Description: JLCPCB Part URL; ComponentLink2URL: https://jlcpcb.com/partdetail/C964026; ComponentLink3Description: LCSC Part URL; ComponentLink3URL: https://lcsc.com/product-detail/Inductors-SMD_HYHONGYEX-HYHONGYEX-HBLS1608-6N8J_C964026.html
footprint IND-0603 (0603 (1608M) Inductor)
pins: 1, 2

## HBLS1608-8N2J
designator L?  Inductance: 8.2nH
Inductor, 8.2nH, ±5%, 0.35Ω, 500mA, SMD 0603; Manufacturer: HYHONGYEX; Manufacturer Part Number: HBLS1608-8N2J; Self-Resonant Frequency: 4.5GHz; Q Factor: 10@100MHz; Package Size: 0603; JLCPCB Basic Part: No; JLCPCB Part Number: C964027; Supplier 1: LCSC; Category: Inductors; Supplier Part Number 1: C964027; Tolerance: ±5%; Rated Current: 500mA; DC Resistance: 0.35Ω; RoHS: Yes; ComponentLink1Description: Datasheet; ComponentLink1URL: https://wmsc.lcsc.com/wmsc/upload/file/pdf/v2/lcsc/2012171938_HYHONGYEX-HBLS1608-8N2J_C964027.pdf; ComponentLink2Description: JLCPCB Part URL; ComponentLink2URL: https://jlcpcb.com/partdetail/C964027; ComponentLink3Description: LCSC Part URL; ComponentLink3URL: https://lcsc.com/product-detail/Inductors-SMD_HYHONGYEX-HYHONGYEX-HBLS1608-8N2J_C964027.html
footprint IND-0603 (0603 (1608M) Inductor)
pins: 1, 2

## HBLS1608-10NJ
designator L?  Inductance: 10nH
Inductor, 10nH, ±5%, 0.4Ω, 300mA, SMD 0603; Manufacturer: HYHONGYEX; Manufacturer Part Number: HBLS1608-10NJ; Self-Resonant Frequency: 3.5GHz; Q Factor: 12@100MHz; Package Size: 0603; JLCPCB Basic Part: No; JLCPCB Part Number: C964028; Supplier 1: LCSC; Category: Inductors; Supplier Part Number 1: C964028; Tolerance: ±5%; Rated Current: 300mA; DC Resistance: 0.4Ω; RoHS: Yes; ComponentLink1Description: Datasheet; ComponentLink1URL: https://wmsc.lcsc.com/wmsc/upload/file/pdf/v2/lcsc/2012171938_HYHONGYEX-HBLS1608-10NJ_C964028.pdf; ComponentLink2Description: JLCPCB Part URL; ComponentLink2URL: https://jlcpcb.com/partdetail/C964028; ComponentLink3Description: LCSC Part URL; ComponentLink3URL: https://lcsc.com/product-detail/Inductors-SMD_HYHONGYEX-HYHONGYEX-HBLS1608-10NJ_C964028.html
footprint IND-0603 (0603 (1608M) Inductor)
pins: 1, 2

## HBLS1608-12NJ
designator L?  Inductance: 12nH
Inductor, 12nH, ±5%, 0.45Ω, 300mA, SMD 0603; Manufacturer: HYHONGYEX; Manufacturer Part Number: HBLS1608-12NJ; Self-Resonant Frequency: 3GHz; Q Factor: 12@100MHz; Package Size: 0603; JLCPCB Basic Part: No; JLCPCB Part Number: C964029; Supplier 1: LCSC; Category: Inductors; Supplier Part Number 1: C964029; Tolerance: ±5%; Rated Current: 300mA; DC Resistance: 0.45Ω; RoHS: Yes; ComponentLink1Description: Datasheet; ComponentLink1URL: https://wmsc.lcsc.com/wmsc/upload/file/pdf/v2/lcsc/2012171938_HYHONGYEX-HBLS1608-12NJ_C964029.pdf; ComponentLink2Description: JLCPCB Part URL; ComponentLink2URL: https://jlcpcb.com/partdetail/C964029; ComponentLink3Description: LCSC Part URL; ComponentLink3URL: https://lcsc.com/product-detail/Inductors-SMD_HYHONGYEX-HYHONGYEX-HBLS1608-12NJ_C964029.html
footprint IND-0603 (0603 (1608M) Inductor)
pins: 1, 2

## HBLS1608-15NJ
designator L?  Inductance: 15nH
Inductor, 15nH, ±5%, 0.5Ω, 300mA, SMD 0603; Manufacturer: HYHONGYEX; Manufacturer Part Number: HBLS1608-15NJ; Self-Resonant Frequency: 2.3GHz; Q Factor: 12@100MHz; Package Size: 0603; JLCPCB Basic Part: No; JLCPCB Part Number: C964030; Supplier 1: LCSC; Category: Inductors; Supplier Part Number 1: C964030; Tolerance: ±5%; Rated Current: 300mA; DC Resistance: 0.5Ω; RoHS: Yes; ComponentLink1Description: Datasheet; ComponentLink1URL: https://wmsc.lcsc.com/wmsc/upload/file/pdf/v2/lcsc/2012171938_HYHONGYEX-HBLS1608-15NJ_C964030.pdf; ComponentLink2Description: JLCPCB Part URL; ComponentLink2URL: https://jlcpcb.com/partdetail/C964030; ComponentLink3Description: LCSC Part URL; ComponentLink3URL: https://lcsc.com/product-detail/Inductors-SMD_HYHONGYEX-HYHONGYEX-HBLS1608-15NJ_C964030.html
footprint IND-0603 (0603 (1608M) Inductor)
pins: 1, 2

## HBLS1608-18NJ
designator L?  Inductance: 18nH
Inductor, 18nH, ±5%, 0.55Ω, 300mA, SMD 0603; Manufacturer: HYHONGYEX; Manufacturer Part Number: HBLS1608-18NJ; Self-Resonant Frequency: 2.2GHz; Q Factor: 12@100MHz; Package Size: 0603; JLCPCB Basic Part: No; JLCPCB Part Number: C964031; Supplier 1: LCSC; Category: Inductors; Supplier Part Number 1: C964031; Tolerance: ±5%; Rated Current: 300mA; DC Resistance: 0.55Ω; RoHS: Yes; ComponentLink1Description: Datasheet; ComponentLink1URL: https://wmsc.lcsc.com/wmsc/upload/file/pdf/v2/lcsc/2012171938_HYHONGYEX-HBLS1608-18NJ_C964031.pdf; ComponentLink2Description: JLCPCB Part URL; ComponentLink2URL: https://jlcpcb.com/partdetail/C964031; ComponentLink3Description: LCSC Part URL; ComponentLink3URL: https://lcsc.com/product-detail/Inductors-SMD_HYHONGYEX-HYHONGYEX-HBLS1608-18NJ_C964031.html
footprint IND-0603 (0603 (1608M) Inductor)
pins: 1, 2

## HBLS1608-22NJ
designator L?  Inductance: 22nH
Inductor, 22nH, ±5%, 0.6Ω, 300mA, SMD 0603; Manufacturer: HYHONGYEX; Manufacturer Part Number: HBLS1608-22NJ; Self-Resonant Frequency: 2GHz; Q Factor: 12@100MHz; Package Size: 0603; JLCPCB Basic Part: No; JLCPCB Part Number: C964032; Supplier 1: LCSC; Category: Inductors; Supplier Part Number 1: C964032; Tolerance: ±5%; Rated Current: 300mA; DC Resistance: 0.6Ω; RoHS: Yes; ComponentLink1Description: Datasheet; ComponentLink1URL: https://wmsc.lcsc.com/wmsc/upload/file/pdf/v2/lcsc/2012171938_HYHONGYEX-HBLS1608-22NJ_C964032.pdf; ComponentLink2Description: JLCPCB Part URL; ComponentLink2URL: https://jlcpcb.com/partdetail/C964032; ComponentLink3Description: LCSC Part URL; ComponentLink3URL: https://lcsc.com/product-detail/Inductors-SMD_HYHONGYEX-HYHONGYEX-HBLS1608-22NJ_C964032.html
footprint IND-0603 (0603 (1608M) Inductor)
pins: 1, 2

## HBLS1608-27NJ
designator L?  Inductance: 27nH
Inductor, 27nH, ±5%, 650mΩ, 300mA, SMD 0603; Manufacturer: HYHONGYEX; Manufacturer Part Number: HBLS1608-27NJ; Self-Resonant Frequency: 1.7GHz; Q Factor: 12@100MHz; Package Size: 0603; JLCPCB Basic Part: No; JLCPCB Part Number: C964033; Supplier 1: LCSC; Category: Inductors; Supplier Part Number 1: C964033; Tolerance: ±5%; Rated Current: 300mA; DC Resistance: 650mΩ; RoHS: Yes; ComponentLink1Description: Datasheet; ComponentLink1URL: https://wmsc.lcsc.com/wmsc/upload/file/pdf/v2/lcsc/2012171939_HYHONGYEX-HBLS1608-27NJ_C964033.pdf; ComponentLink2Description: JLCPCB Part URL; ComponentLink2URL: https://jlcpcb.com/partdetail/C964033; ComponentLink3Description: LCSC Part URL; ComponentLink3URL: https://lcsc.com/product-detail/Inductors-SMD_HYHONGYEX-HYHONGYEX-HBLS1608-27NJ_C964033.html
footprint IND-0603 (0603 (1608M) Inductor)
pins: 1, 2

## HBLS1608-33NJ
designator L?  Inductance: 33nH
Inductor, 33nH, ±5%, 0.7Ω, 300mA, SMD 0603; Manufacturer: HYHONGYEX; Manufacturer Part Number: HBLS1608-33NJ; Self-Resonant Frequency: 1.5GHz; Q Factor: 12@100MHz; Package Size: 0603; JLCPCB Basic Part: No; JLCPCB Part Number: C964034; Supplier 1: LCSC; Category: Inductors; Supplier Part Number 1: C964034; Tolerance: ±5%; Rated Current: 300mA; DC Resistance: 0.7Ω; RoHS: Yes; ComponentLink1Description: Datasheet; ComponentLink1URL: https://wmsc.lcsc.com/wmsc/upload/file/pdf/v2/lcsc/2012171939_HYHONGYEX-HBLS1608-33NJ_C964034.pdf; ComponentLink2Description: JLCPCB Part URL; ComponentLink2URL: https://jlcpcb.com/partdetail/C964034; ComponentLink3Description: LCSC Part URL; ComponentLink3URL: https://lcsc.com/product-detail/Inductors-SMD_HYHONGYEX-HYHONGYEX-HBLS1608-33NJ_C964034.html
footprint IND-0603 (0603 (1608M) Inductor)
pins: 1, 2

## HBLS1608-39NJ
designator L?  Inductance: 39nH
Inductor, 39nH, ±5%, 0.7Ω, 300mA, SMD 0603; Manufacturer: HYHONGYEX; Manufacturer Part Number: HBLS1608-39NJ; Self-Resonant Frequency: 1.4GHz; Q Factor: 12@100MHz; Package Size: 0603; JLCPCB Basic Part: No; JLCPCB Part Number: C964035; Supplier 1: LCSC; Category: Inductors; Supplier Part Number 1: C964035; Tolerance: ±5%; Rated Current: 300mA; DC Resistance: 0.7Ω; RoHS: Yes; ComponentLink1Description: Datasheet; ComponentLink1URL: https://wmsc.lcsc.com/wmsc/upload/file/pdf/v2/lcsc/2012171939_HYHONGYEX-HBLS1608-39NJ_C964035.pdf; ComponentLink2Description: JLCPCB Part URL; ComponentLink2URL: https://jlcpcb.com/partdetail/C964035; ComponentLink3Description: LCSC Part URL; ComponentLink3URL: https://lcsc.com/product-detail/Inductors-SMD_HYHONGYEX-HYHONGYEX-HBLS1608-39NJ_C964035.html
footprint IND-0603 (0603 (1608M) Inductor)
pins: 1, 2

## HBLS1608-47NJ
designator L?  Inductance: 47nH
Inductor, 47nH, ±5%, 0.7Ω, 300mA, SMD 0603; Manufacturer: HYHONGYEX; Manufacturer Part Number: HBLS1608-47NJ; Self-Resonant Frequency: 1.2GHz; Q Factor: 12@100MHz; Package Size: 0603; JLCPCB Basic Part: No; JLCPCB Part Number: C964036; Supplier 1: LCSC; Category: Inductors; Supplier Part Number 1: C964036; Tolerance: ±5%; Rated Current: 300mA; DC Resistance: 0.7Ω; RoHS: Yes; ComponentLink1Description: Datasheet; ComponentLink1URL: https://wmsc.lcsc.com/wmsc/upload/file/pdf/v2/lcsc/2012171939_HYHONGYEX-HBLS1608-47NJ_C964036.pdf; ComponentLink2Description: JLCPCB Part URL; ComponentLink2URL: https://jlcpcb.com/partdetail/C964036; ComponentLink3Description: LCSC Part URL; ComponentLink3URL: https://lcsc.com/product-detail/Inductors-SMD_HYHONGYEX-HYHONGYEX-HBLS1608-47NJ_C964036.html
footprint IND-0603 (0603 (1608M) Inductor)
pins: 1, 2

## HBLS1608-56NJ
designator L?  Inductance: 56nH
Inductor, 56nH, ±5%, 0.75Ω, 300mA, SMD 0603; Manufacturer: HYHONGYEX; Manufacturer Part Number: HBLS1608-56NJ; Self-Resonant Frequency: 1.1GHz; Q Factor: 12@100MHz; Package Size: 0603; JLCPCB Basic Part: No; JLCPCB Part Number: C964037; Supplier 1: LCSC; Category: Inductors; Supplier Part Number 1: C964037; Tolerance: ±5%; Rated Current: 300mA; DC Resistance: 0.75Ω; RoHS: Yes; ComponentLink1Description: Datasheet; ComponentLink1URL: https://wmsc.lcsc.com/wmsc/upload/file/pdf/v2/lcsc/2012171939_HYHONGYEX-HBLS1608-56NJ_C964037.pdf; ComponentLink2Description: JLCPCB Part URL; ComponentLink2URL: https://jlcpcb.com/partdetail/C964037; ComponentLink3Description: LCSC Part URL; ComponentLink3URL: https://lcsc.com/product-detail/Inductors-SMD_HYHONGYEX-HYHONGYEX-HBLS1608-56NJ_C964037.html
footprint IND-0603 (0603 (1608M) Inductor)
pins: 1, 2

## HBLS1608-68NJ
designator L?  Inductance: 68nH
Inductor, 68nH, ±5%, 0.85Ω, 300mA, SMD 0603; Manufacturer: HYHONGYEX; Manufacturer Part Number: HBLS1608-68NJ; Self-Resonant Frequency: 900MHz; Q Factor: 12@100MHz; Package Size: 0603; JLCPCB Basic Part: No; JLCPCB Part Number: C964038; Supplier 1: LCSC; Category: Inductors; Supplier Part Number 1: C964038; Tolerance: ±5%; Rated Current: 300mA; DC Resistance: 0.85Ω; RoHS: Yes; ComponentLink1Description: Datasheet; ComponentLink1URL: https://wmsc.lcsc.com/wmsc/upload/file/pdf/v2/lcsc/2012171939_HYHONGYEX-HBLS1608-68NJ_C964038.pdf; ComponentLink2Description: JLCPCB Part URL; ComponentLink2URL: https://jlcpcb.com/partdetail/C964038; ComponentLink3Description: LCSC Part URL; ComponentLink3URL: https://lcsc.com/product-detail/Inductors-SMD_HYHONGYEX-HYHONGYEX-HBLS1608-68NJ_C964038.html
footprint IND-0603 (0603 (1608M) Inductor)
pins: 1, 2